# Altium footprint library My Footprint 3D.PCBLIB: 447 footprints (part 25 of 29)
Each footprint in its own frame and in the unit in brackets; x right, y up, seen from the top. Pads: shape width x height; smd on the part's side, far side on the other; paste and mask are expansions set on the pad; w line width, h text height; cw(c..) or ccw(c..) is an arc to the next point about the centre after c.
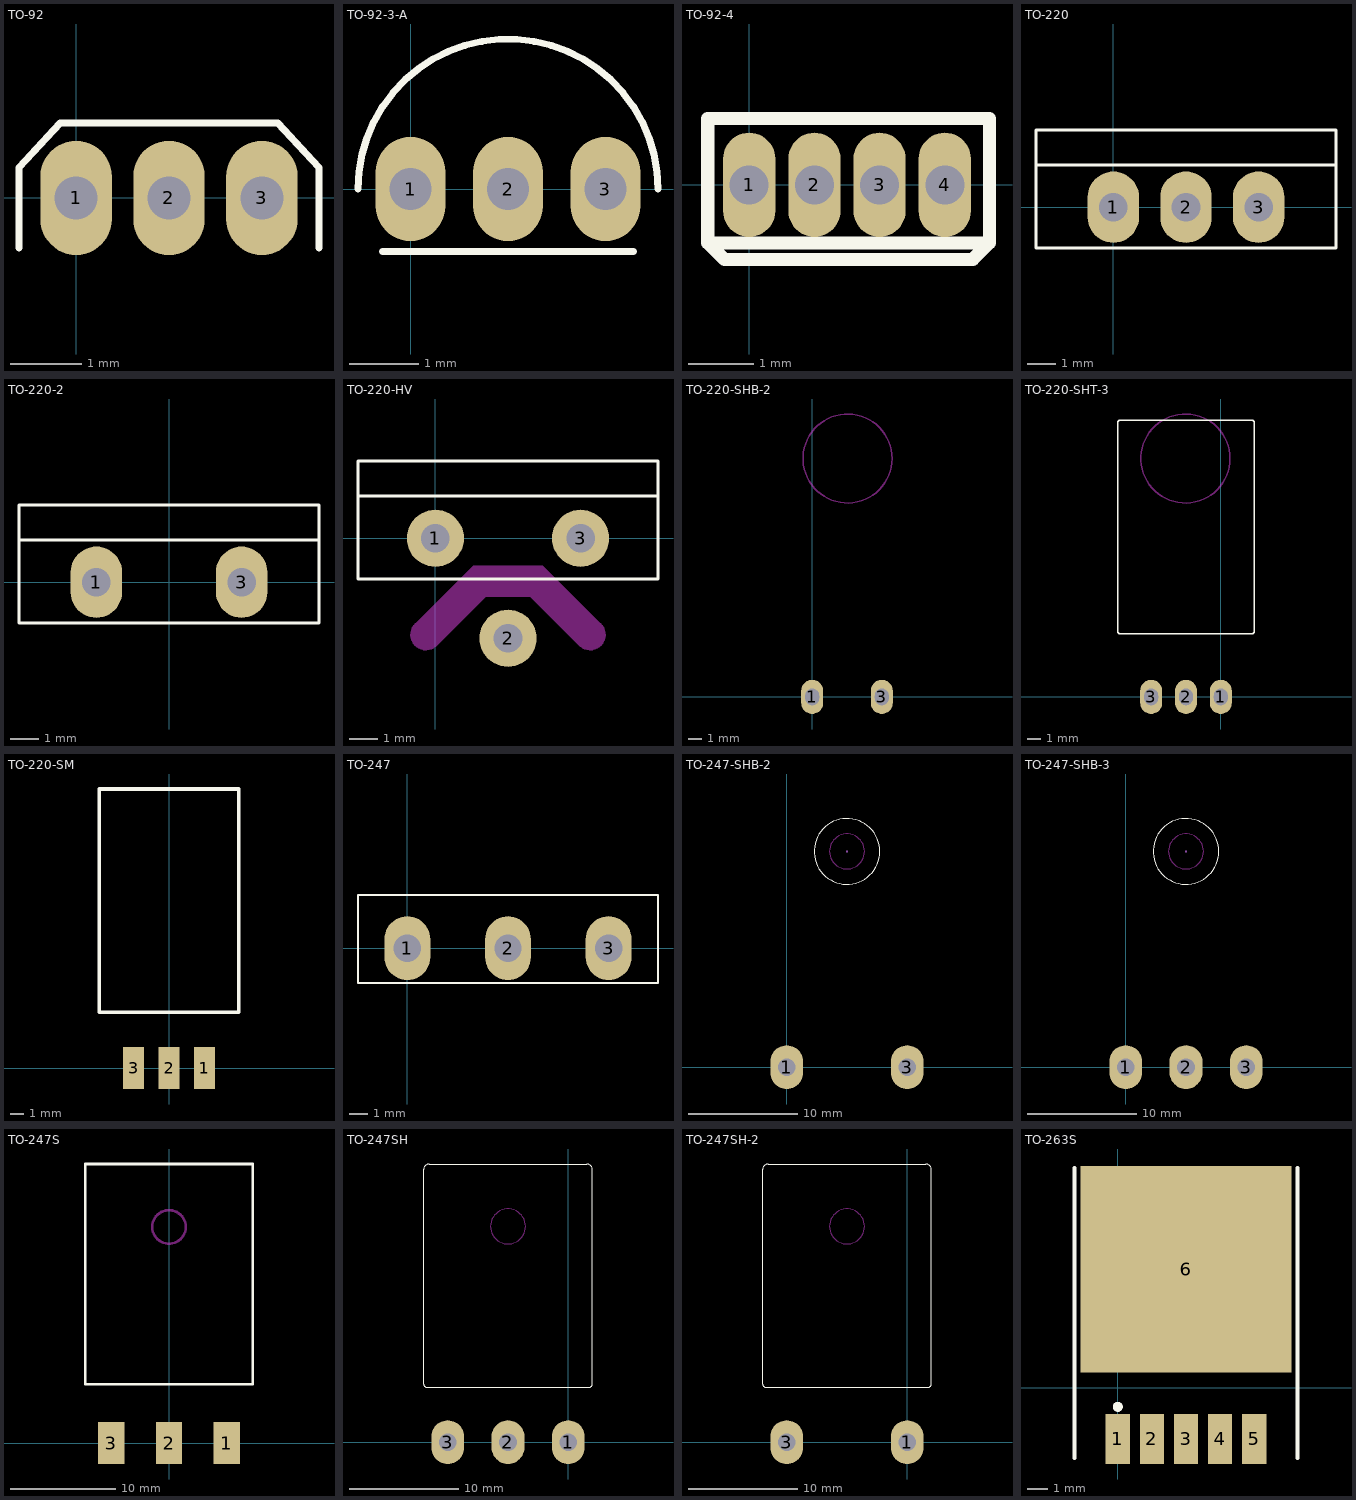
[diagram p24: the footprints below, top view; thin cyan lines are the x and y axes]

## TO-92 [mm]
pads (3):
  oval 1x1.6 hole 0.6: 1(0,0) 2(1.3,0) 3(2.6,0)
Top Overlay:
  lines w0.1: -0.8,-0.7 -0.8,0.425 -0.225,1.05 2.825,1.05 3.4,0.425 3.4,-0.7
3D body: height 6, standoff 3, extent -0.75,-0.7 3.35,0.9
3D body: height 3, standoff -2, extent 2.375,-0.15 2.825,0.15
3D body: height 3, standoff -2, extent -0.225,-0.15 0.225,0.15
3D body: height 3, standoff -2, extent 1.075,-0.15 1.525,0.15

## TO-92-3-A [mm]
pads (3):
  oval 1x1.5 hole 0.6: 1(0,0) 2(1.4,0) 3(2.8,0)
Top Overlay:
  lines w0.1: -0.754,0 cw(c1.4,0) 3.554,0 ; -0.4,-0.9 3.2,-0.9
3D body: height 1, standoff -2, extent 1.2,-0.2 1.6,0.2
3D body: height 1, standoff -2, extent 2.6,-0.2 3,0.2
3D body: height 5.5, standoff 1, extent -0.9,-1 3.7,2.314
3D body: height 1, standoff -2, extent -0.2,-0.2 0.2,0.2

## TO-92-4 [mm]
pads (4):
  oval 0.8x1.6 hole 0.6: 1(0,0) 2(1,0) 3(2,0) 4(3,0)
Top Overlay:
  lines w0.2: -0.635,-0.889 -0.381,-1.143 3.429,-1.143 3.683,-0.889 ; -0.635,-0.889 -0.635,1.016 3.683,1.016 3.683,-0.889 ; -0.635,-0.889 3.683,-0.889

## TO-220 [mm]
pads (3):
  oval 1.8x2.5 hole 1: 1(0,0) 2(2.54,0) 3(5.08,0)
Top Overlay:
  lines w0.1: 7.79,1.475 -2.71,1.475 ; -2.71,1.475 -2.71,2.7 7.79,2.7 7.79,-1.425 -2.71,-1.425 -2.71,1.475
3D body: height 3, standoff 0.5, extent 4.38,-0.25 5.78,0.25
3D body: height 1, standoff -2, extent 4.73,-0.25 5.43,0.25
3D body: height 3, standoff 0.5, extent 1.84,-0.25 3.24,0.25
3D body: height 1, standoff -2, extent 2.19,-0.25 2.89,0.25
3D body: height 3, standoff 0.5, extent -0.7,-0.25 0.7,0.25
3D body: height 1, standoff -2, extent -0.35,-0.25 0.35,0.25
3D body: height 13.3, standoff 3, extent -2.794,-1.524 7.874,1.499
3D body: height 19.4, standoff 13.3, extent -2.794,1.499 7.874,2.794
3D body: height 6.5, standoff 3, extent -2.794,1.499 7.874,2.794
3D body: height 13.3, standoff 3, extent 6.528,1.499 7.874,2.794
3D body: height 19.4, standoff 13.3, extent -2.794,1.499 7.874,2.794
3D body: height 13.3, standoff 6.5, extent -1.448,1.499 6.528,2.794
3D body: height 13.3, standoff 3, extent -2.794,1.499 -1.448,2.794
3D body: height 17.6, standoff 14.4, extent 0.946,1.419 4.134,2.819

## TO-220-2 [mm]
pads (2):
  oval 1.8x2.5 hole 1: 1(-2.54,0) 3(2.54,0)
Top Overlay:
  lines w0.1: 5.25,1.475 -5.25,1.475 ; -5.25,1.475 -5.25,2.7 5.25,2.7 5.25,-1.425 -5.25,-1.425 -5.25,1.475
3D body: height 13.3, standoff 3, extent -5.334,-1.524 5.334,1.499
3D body: height 19.4, standoff 13.3, extent -5.334,1.499 5.334,2.794
3D body: height 6.5, standoff 3, extent -5.334,1.499 5.334,2.794
3D body: height 13.3, standoff 3, extent 3.988,1.499 5.334,2.794
3D body: height 19.4, standoff 13.3, extent -5.334,1.499 5.334,2.794
3D body: height 13.3, standoff 6.5, extent -3.988,1.499 3.988,2.794
3D body: height 13.3, standoff 3, extent -5.334,1.499 -3.988,2.794
3D body: height 17.6, standoff 14.4, extent -1.594,1.419 1.594,2.819
3D body: height 1, standoff -2, extent -2.89,-0.25 -2.19,0.25
3D body: height 3, standoff 0.5, extent -3.24,-0.25 -1.84,0.25
3D body: height 1, standoff -2, extent 2.19,-0.25 2.89,0.25
3D body: height 3, standoff 0.5, extent 1.84,-0.25 3.24,0.25

## TO-220-HV [mm]
pads (3):
  round 2 hole 1: 1(0,0) 2(2.54,-3.5) 3(5.08,0)
Top Overlay:
  lines w0.1: 7.79,1.475 -2.71,1.475 ; -2.71,1.475 -2.71,-1.425 7.79,-1.425 7.79,2.7 -2.71,2.7 -2.71,1.475
Keep-Out Layer:
  board cut-out: 1.754,-2 1.756,-2.001 3.323,-2.001 5.063,-3.741 5.096,-3.774 5.173,-3.826 5.259,-3.862 5.351,-3.88 5.398,-3.88 5.44,-3.88 5.49,-3.88 5.587,-3.861 5.679,-3.823 5.762,-3.767 5.797,-3.732 5.827,-3.702 5.874,-3.631 5.907,-3.553 5.923,-3.47 5.923,-3.427 5.923,-3.388 5.923,-3.334 5.902,-3.229 5.861,-3.129 5.801,-3.04 5.763,-3.002 3.772,-1.011 3.77,-1.008 3.764,-1.004 3.757,-1.001 3.75,-1 3.747,-1 1.34,-1 -0.725,-3.065 -0.753,-3.093 -0.797,-3.159 -0.828,-3.233 -0.843,-3.31 -0.843,-3.35 -0.843,-3.403 -0.823,-3.507 -0.782,-3.605 -0.723,-3.693 -0.686,-3.73 -0.671,-3.745 -0.639,-3.777 -0.564,-3.827 -0.481,-3.861 -0.393,-3.879 -0.348,-3.879 -0.278,-3.879 -0.239,-3.879 -0.162,-3.864 -0.09,-3.834 -0.025,-3.79 0.003,-3.763
  lines w0.1: -0.676,-3.009 ccw(c-0.335,-3.375) -0.007,-3.752 ; -0.673,-3.013 1.34,-1 3.74,-1 5.752,-3.013 ; -0.003,-3.757 1.754,-2 3.326,-2 5.083,-3.757 ; 5.087,-3.752 ccw(c5.415,-3.375) 5.756,-3.009
3D body: height 2, standoff 1.5, extent 2.19,-3.25 2.89,-1.75
3D body: height 2, standoff 1.5, extent 1.84,-1.75 3.24,-0.275
3D body: height 3, standoff 1.5, extent 1.84,-0.275 3.24,0.225
3D body: height 17.6, standoff 14.4, extent 0.946,1.419 4.134,2.819
3D body: height 13.3, standoff 3, extent -2.794,1.499 -1.448,2.794
3D body: height 13.3, standoff 6.5, extent -1.448,1.499 6.528,2.794
3D body: height 19.4, standoff 13.3, extent -2.794,1.499 7.874,2.794
3D body: height 13.3, standoff 3, extent 6.528,1.499 7.874,2.794
3D body: height 6.5, standoff 3, extent -2.794,1.499 7.874,2.794
3D body: height 19.4, standoff 13.3, extent -2.794,1.499 7.874,2.794
3D body: height 13.3, standoff 3, extent -2.794,-1.524 7.874,1.499
3D body: height 1, standoff -2, extent -0.35,-0.25 0.35,0.25
3D body: height 3, standoff 0.5, extent -0.7,-0.25 0.7,0.25
3D body: height 2, standoff -2, extent 2.19,-3.75 2.89,-3.25
3D body: height 1, standoff -2, extent 4.73,-0.25 5.43,0.25
3D body: height 3, standoff 0.5, extent 4.38,-0.25 5.78,0.25

## TO-220-SHB-2 [mm]
pads (2):
  oval 1.6x2.5 hole 1 slot 1.2 at 90 deg: 1(0,0) 3(5.08,0)
Bottom Overlay:
  lines w0.1: -2.46,4.8 ccw(c-2.26,4.8) -2.26,4.6 7.34,4.6 ccw(c7.34,4.8) 7.54,4.8 7.54,20 ccw(c7.34,20) 7.34,20.2 -2.26,20.2 ccw(c-2.26,20) -2.46,20 -2.46,4.8
Keep-Out Layer:
  circle w0.1: c2.58,17.4 r3.25
3D body: height 2, standoff 1.5, extent -0.432,-0.279 0.432,0.66
3D body: height 2, standoff -2, extent -0.432,-0.279 0.432,0.279
3D body: height 2, standoff 1.5, extent -0.7,0.66 0.7,4.46
3D body: height 4.5, standoff 3, extent 1.04,15.903 4.028,18.897
3D body: height 4.49, standoff 0, extent -2.66,4.4 7.74,13.4
3D body: height 4.5, standoff 3, extent -2.66,6.6 7.74,20.4
3D body: height 2, standoff 1.5, extent 4.38,0.66 5.78,4.46
3D body: height 2, standoff -2, extent 4.648,-0.279 5.512,0.279
3D body: height 2, standoff 1.5, extent 4.648,-0.279 5.512,0.66

## TO-220-SHT-3 [mm]
pads (3):
  oval 1.6x2.5 hole 1 slot 1.2 at 90 deg: 1(0,0) 2(-2.54,0) 3(-5.08,0)
Top Overlay:
  lines w0.1: -7.54,4.8 ccw(c-7.34,4.8) -7.34,4.6 2.26,4.6 ccw(c2.26,4.8) 2.46,4.8 2.46,20 ccw(c2.26,20) 2.26,20.2 -7.34,20.2 ccw(c-7.34,20) -7.54,20 -7.54,4.8
Keep-Out Layer:
  circle w0.1: c-2.58,17.4 r3.25
3D body: height 2, standoff 1.5, extent -0.432,-0.279 0.432,0.66
3D body: height 2, standoff -2, extent -0.432,-0.279 0.432,0.279
3D body: height 2, standoff 1.5, extent -0.7,0.66 0.7,4.46
3D body: height 2, standoff 1.5, extent -2.972,-0.279 -2.108,0.66
3D body: height 2, standoff -2, extent -2.972,-0.279 -2.108,0.279
3D body: height 2, standoff 1.5, extent -3.24,0.66 -1.84,4.46
3D body: height 4.5, standoff 3, extent -4.028,15.903 -1.04,18.897
3D body: height 4.49, standoff 0, extent -7.74,4.4 2.66,13.4
3D body: height 4.5, standoff 3, extent -7.74,6.6 2.66,20.4
3D body: height 2, standoff 1.5, extent -5.78,0.66 -4.38,4.46
3D body: height 2, standoff -2, extent -5.512,-0.279 -4.648,0.279
3D body: height 2, standoff 1.5, extent -5.512,-0.279 -4.648,0.66

## TO-220-SM [mm]
pads (3):
  rect 1.524x3 smd: 1(2.54,0) 2(0,0) 3(-2.54,0)
Top Overlay:
  lines w0.254: -5,4 -5,20 5,20 5,4 -5,4
3D body: height 0.5, standoff 0, extent -2.978,-1.25 -2.097,0.45
3D body: height 2.3, standoff 0, extent -2.978,0.45 -2.097,0.95
3D body: height 2.3, standoff 1.8, extent -3.25,0.9 -1.825,4.05
3D body: height 4.5, standoff 0, extent -4.975,8.05 -3.975,13.95
3D body: height 4.5, standoff 0, extent 4.025,8.05 5.025,13.95
3D body: height 4.5, standoff 0, extent -4.975,4.05 5.025,8.05
3D body: height 3, standoff 0, extent -3.975,7.95 4.025,13.95
3D body: height 4.5, standoff 3, extent -4.975,13.95 5.025,19.95
3D body: height 4.51, standoff 2.99, extent -1.818,15.225 1.768,18.818
3D body: height 2.3, standoff 1.8, extent -0.71,0.9 0.715,4.05
3D body: height 2.3, standoff 0, extent -0.438,0.45 0.443,0.95
3D body: height 0.5, standoff 0, extent -0.438,-1.25 0.443,0.45
3D body: height 2.3, standoff 1.8, extent 1.83,0.9 3.255,4.05
3D body: height 2.3, standoff 0, extent 2.102,0.45 2.983,0.95
3D body: height 0.5, standoff 0, extent 2.102,-1.25 2.983,0.45
3D body: height 4.5, standoff 3, extent -3.975,7.975 4.025,13.975

## TO-247 [mm]
pads (3):
  oval 2.5x3.5 hole 1.5: 1(0,0) 2(5.5,0) 3(11,0)
Top Overlay:
  lines w0.1: -2.7,-1.9 13.7,-1.9 13.7,2.9 -2.7,2.9 -2.7,-1.9
3D body: height 5, standoff 1, extent 3.95,-0.3 7.05,0.3
3D body: height 3, standoff -2, extent 4.9,-0.3 6.1,0.3
3D body: height 5, standoff 1, extent 9.95,-0.3 12.05,0.3
3D body: height 3, standoff -2, extent 10.4,-0.3 11.6,0.3
3D body: height 3, standoff -2, extent -0.6,-0.3 0.6,0.3
3D body: height 5, standoff 1, extent -1.05,-0.3 1.05,0.3
3D body: height 21.1, standoff 17.9, extent 3.906,-2.025 7.094,3.075
3D body: height 22.99, standoff 16.01, extent 2.014,-2 8.986,3.05
3D body: height 24, standoff 9.7, extent -1.55,2.025 12.55,3.025
3D body: height 25, standoff 5, extent -2.8,-2 13.8,3

## TO-247-SHB-2 [mm]
pads (2):
  oval 3x4 hole 1.6: 1(0,0) 3(11,0)
Top Overlay:
  circle w0.1: c5.5,19.7 r3
Bottom Overlay:
  lines w0.1: -2.2,5.3 ccw(c-1.9,5.3) -1.9,5 12.9,5 ccw(c12.9,5.3) 13.2,5.3 13.2,24.9 ccw(c12.7,24.9) 12.7,25.4 -1.7,25.4 ccw(c-1.7,24.9) -2.2,24.9 -2.2,5.3
Keep-Out Layer:
  circle w0.1: c5.5,19.7 r1.6
Mechanical 1:
  lines w0.2: 5.5,19.7 cw(c5.5,19.7) 5.5,19.7
3D body: height 5, standoff 0, extent -2.5,4.7 13.5,25.7
3D body: height 5.02, standoff 1, extent 2.2,16.407 8.774,22.993
3D body: height 5.01, standoff 1, extent -1.511,7.691 12.509,24.5
3D body: height 5.03, standoff -0.01, extent 3.7,17.904 7.286,21.496
3D body: height 2.55, standoff 2, extent -0.6,1.2 1.4,4.7
3D body: height 2.55, standoff 2, extent -0.6,0.3 0.6,1.3
3D body: height 2.55, standoff -2, extent -0.6,-0.3 0.6,0.3
3D body: height 2.55, standoff -2, extent 10.4,-0.3 11.6,0.3
3D body: height 2.55, standoff 2, extent 10.4,0.3 11.6,1.3
3D body: height 2.55, standoff 2, extent 9.6,1.2 11.6,4.7

## TO-247-SHB-3 [mm]
pads (3):
  oval 3x4 hole 1.6: 1(0,0) 2(5.5,0) 3(11,0)
Top Overlay:
  circle w0.1: c5.5,19.7 r3
Bottom Overlay:
  lines w0.1: -2.2,5.3 ccw(c-1.9,5.3) -1.9,5 12.9,5 ccw(c12.9,5.3) 13.2,5.3 13.2,24.9 ccw(c12.7,24.9) 12.7,25.4 -1.7,25.4 ccw(c-1.7,24.9) -2.2,24.9 -2.2,5.3
Keep-Out Layer:
  circle w0.1: c5.5,19.7 r1.6
Mechanical 1:
  lines w0.2: 5.5,19.7 cw(c5.5,19.7) 5.5,19.7
3D body: height 2.55, standoff -2, extent 4.9,-0.3 6.1,0.3
3D body: height 2.55, standoff 2, extent 4.9,0.3 6.1,1.3
3D body: height 2.55, standoff 2, extent 4.1,1.2 6.9,4.7
3D body: height 2.55, standoff 2, extent 9.6,1.2 11.6,4.7
3D body: height 2.55, standoff 2, extent 10.4,0.3 11.6,1.3
3D body: height 2.55, standoff -2, extent 10.4,-0.3 11.6,0.3
3D body: height 2.55, standoff -2, extent -0.6,-0.3 0.6,0.3
3D body: height 2.55, standoff 2, extent -0.6,0.3 0.6,1.3
3D body: height 2.55, standoff 2, extent -0.6,1.2 1.4,4.7
3D body: height 5.03, standoff -0.01, extent 3.7,17.904 7.286,21.496
3D body: height 5.01, standoff 1, extent -1.511,7.691 12.509,24.5
3D body: height 5.02, standoff 1, extent 2.2,16.407 8.774,22.993
3D body: height 5, standoff 0, extent -2.5,4.7 13.5,25.7

## TO-247S [mm]
pads (3):
  rect 2.5x4 smd: 1(5.5,0) 2(0,0) 3(-5.5,0)
Top Overlay:
  lines w0.254: -8,5.6 8,5.6 8,26.6 -8,26.6 -8,5.6
Bottom Overlay:
  circle w0.254: c0,20.6 r3.5
Keep-Out Layer:
  circle w0.254: c0,20.6 r1.6

## TO-247SH [mm]
pads (3):
  oval 3x4 hole 1.6: 1(0,0) 2(-5.5,0) 3(-11,0)
Top Overlay:
  lines w0.1: -13.2,5.3 ccw(c-12.9,5.3) -12.9,5 1.9,5 ccw(c1.9,5.3) 2.2,5.3 2.2,24.9 ccw(c1.7,24.9) 1.7,25.4 -12.7,25.4 ccw(c-12.7,24.9) -13.2,24.9 -13.2,5.3
Keep-Out Layer:
  circle w0.1: c-5.5,19.7 r1.6
3D body: height 2.55, standoff -2, extent -6.1,-0.3 -4.9,0.3
3D body: height 2.55, standoff 2, extent -6.1,0.3 -4.9,1.3
3D body: height 2.55, standoff 2, extent -6.9,1.2 -4.1,4.7
3D body: height 2.55, standoff 2, extent -11.6,1.2 -9.6,4.7
3D body: height 2.55, standoff 2, extent -11.6,0.3 -10.4,1.3
3D body: height 2.55, standoff -2, extent -11.6,-0.3 -10.4,0.3
3D body: height 2.55, standoff -2, extent -0.6,-0.3 0.6,0.3
3D body: height 2.55, standoff 2, extent -0.6,0.3 0.6,1.3
3D body: height 2.55, standoff 2, extent -1.4,1.2 0.6,4.7
3D body: height 5.03, standoff -0.01, extent -7.286,17.904 -3.7,21.497
3D body: height 5.01, standoff 1, extent -12.509,7.691 1.511,24.5
3D body: height 5.02, standoff 1, extent -8.774,16.407 -2.2,22.994
3D body: height 5, standoff 0, extent -13.5,4.7 2.5,25.7

## TO-247SH-2 [mm]
pads (2):
  oval 3x4 hole 1.6: 1(0,0) 3(-11,0)
Top Overlay:
  lines w0.1: -13.2,5.3 ccw(c-12.9,5.3) -12.9,5 1.9,5 ccw(c1.9,5.3) 2.2,5.3 2.2,24.9 ccw(c1.7,24.9) 1.7,25.4 -12.7,25.4 ccw(c-12.7,24.9) -13.2,24.9 -13.2,5.3
Keep-Out Layer:
  circle w0.1: c-5.5,19.7 r1.6
3D body: height 2.55, standoff 2, extent -11.6,1.2 -9.6,4.7
3D body: height 2.55, standoff 2, extent -11.6,0.3 -10.4,1.3
3D body: height 2.55, standoff -2, extent -11.6,-0.3 -10.4,0.3
3D body: height 2.55, standoff -2, extent -0.6,-0.3 0.6,0.3
3D body: height 2.55, standoff 2, extent -0.6,0.3 0.6,1.3
3D body: height 2.55, standoff 2, extent -1.4,1.2 0.6,4.7
3D body: height 5.03, standoff -0.01, extent -7.286,17.904 -3.7,21.497
3D body: height 5.01, standoff 1, extent -12.509,7.691 1.511,24.5
3D body: height 5.02, standoff 1, extent -8.774,16.407 -2.2,22.994
3D body: height 5, standoff 0, extent -13.5,4.7 2.5,25.7

## TO-263S [mm] "5-Lead TO-263 Surface Mount Package (S)"
height 5
pads (6):
  rect 1.2x2.5 smd: 1(0,-2.54) 2(1.7,-2.54) 3(3.4,-2.54) 4(5.1,-2.54) 5(6.8,-2.54)
  rect 10.5x10.3 smd: 6(3.4,5.91)
Top Overlay:
  circle w0.25: c0,-0.94 r0.125
  lines w0.2: -2.15,-3.49 -2.15,10.96 ; 8.95,-3.49 8.95,10.96